# Altium footprint library 电容封装库.PcbLib: 100 footprints (part 5 of 7)
Each footprint in its own frame and in the unit in brackets; x right, y up, seen from the top. Pads: shape width x height; smd on the part's side, far side on the other; paste and mask are expansions set on the pad; w line width, h text height; cw(c..) or ccw(c..) is an arc to the next point about the centre after c.
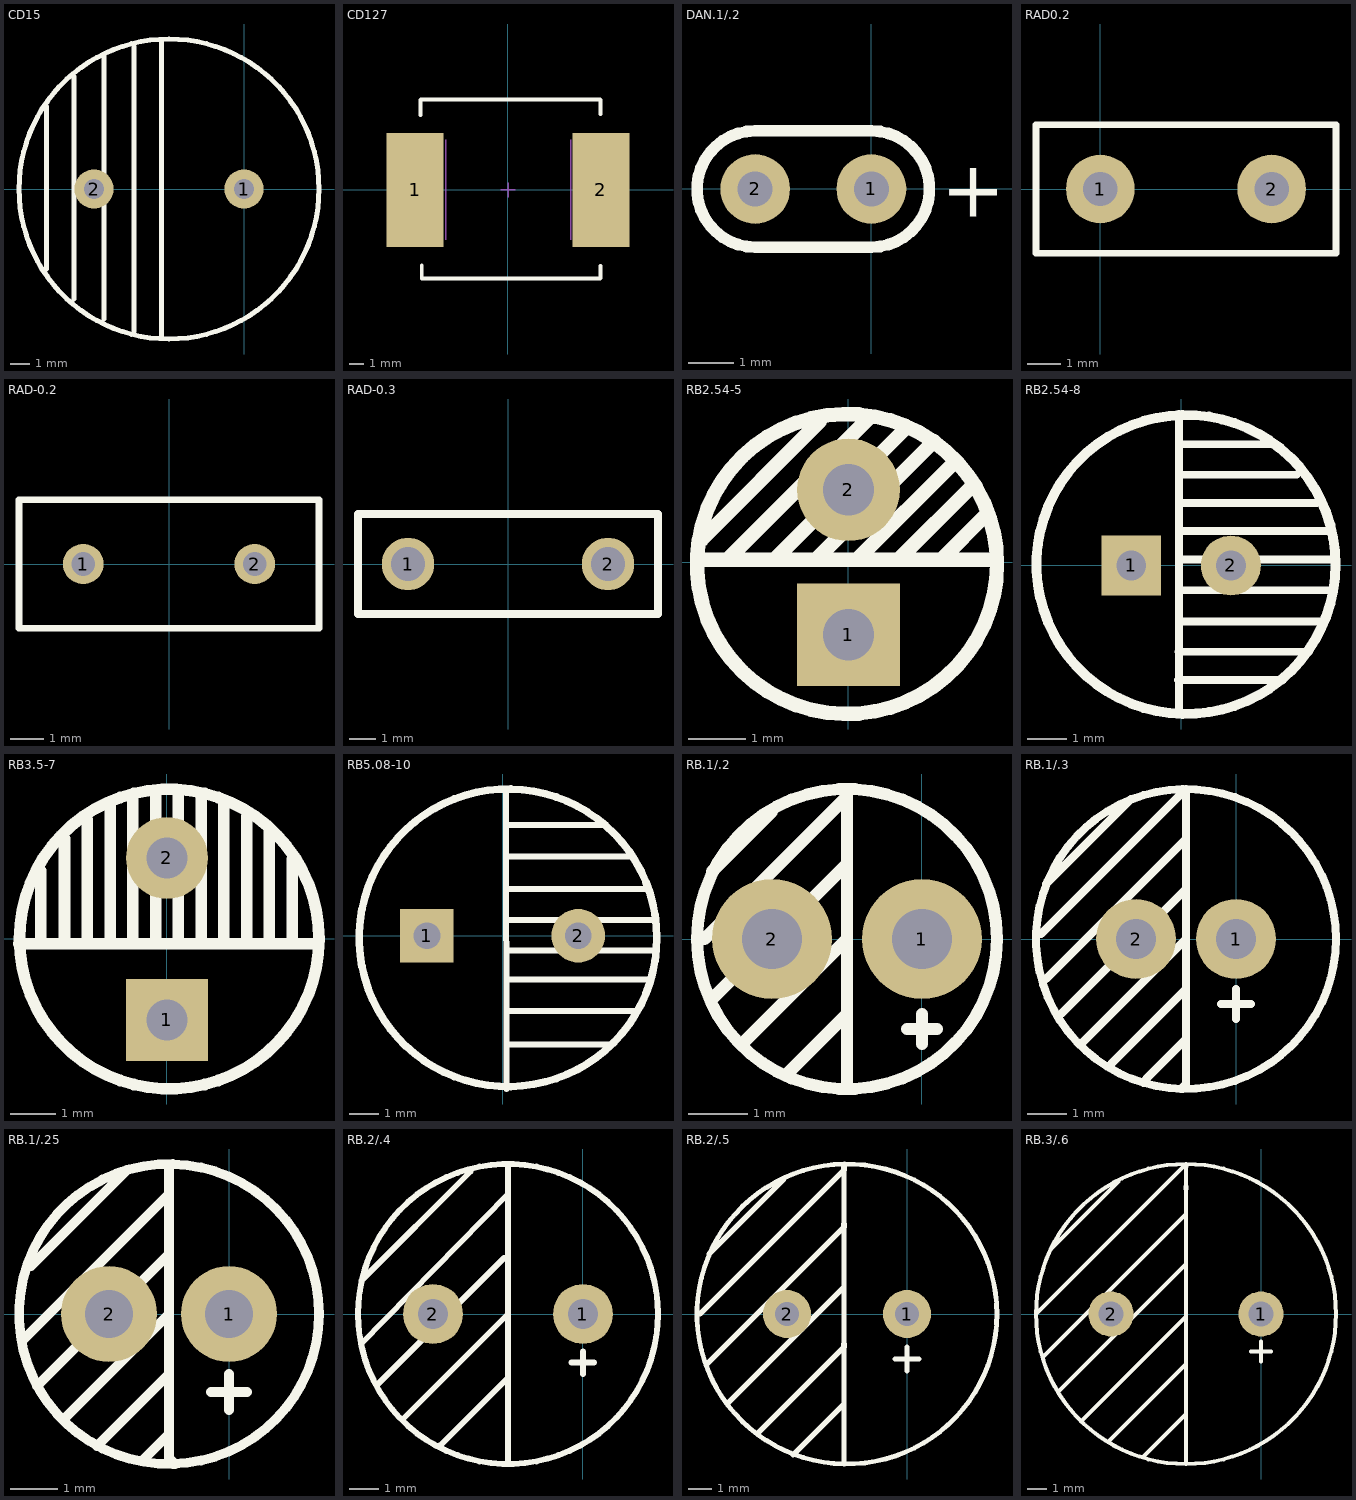
[diagram p4: the footprints below, top view; thin cyan lines are the x and y axes]

## CD15 [mm]
pads (2):
  round 2 hole 1: 1(0,0) 2(-7.62,0)
Top Overlay:
  circle w0.254: c-3.81,0 r7.62
  lines w0.254: -10.033,-4.064 -10.033,4.191 ; -8.636,-5.588 -8.636,5.715 ; -7.112,-6.604 -7.112,6.731 ; -5.588,-7.239 -5.588,7.239 ; -4.191,-7.493 -4.191,7.493

## CD127 [mm]
pads (2):
  rect 4x8 smd: 1(-6.5,0) 2(6.5,0)
Top Overlay:
  lines w0.254: -6.121,5.232 -6.121,6.299 -6.096,6.325 6.452,6.325 6.477,6.299 6.477,5.309 ; -6.045,-5.283 -6.045,-6.198 6.452,-6.198 6.477,-6.172 6.477,-5.309
Mechanical 15:
  lines w0.1: -4.375,-3.5 -4.375,3.5 ; -0.5,0 0.5,0 ; 0,-0.5 0,0.5 ; 4.375,-3.5 4.375,3.5
3D body: height 6.7, standoff 0, extent -6.048,-6.172 6.452,6.328

## DAN.1/.2 [mil]
pads (2):
  round 60 hole 30: 1(0,0) 2(-100,0)
Top Overlay:
  lines w10: -100,-50 cw(c-100,0) -100,50 0,50 cw(c0,0) 0,-50 -100,-50
  text "+" at 60,-24 h48

## RAD0.2 [mil]
pads (2):
  round 80 hole 40: 1(0,0) 2(200,0)
Top Overlay:
  lines w8: -75,-75 275,-75 275,75 -75,75 -75,-75

## RAD-0.2 [mm] "Radial Cap, Thru-Hole; 2 Leads; 0.2 in Pin Spacing"
pads (2):
  round 1.2 hole 0.7: 1(-2.54,0) 2(2.54,0)
Top Overlay:
  lines w0.2: -4.445,-1.905 4.445,-1.905 4.445,1.905 -4.445,1.905 -4.445,-1.905

## RAD-0.3 [mm]
height 1.99
pads (2):
  round 2 hole 1.3: 1(-3.81,0) 2(3.81,0)
Top Overlay:
  lines w0.305: -5.715,-1.905 5.715,-1.905 5.715,1.905 -5.715,1.905 -5.715,-1.905
3D body: height 5, standoff 0, extent -5.61,-1 5.59,1
3D body: height 1, standoff 0, extent 3.19,-0.599 4.385,0.599
3D body: height 1, standoff 0, extent -4.43,-0.599 -3.235,0.599

## RB2.54-5 [mm] "直插电解电容"
pads (2):
  rect 1.8x1.8 hole 0.9: 1(0,-1.27)
  round 1.8 hole 0.9: 2(0,1.27)
Top Overlay:
  circle w0.254: c-0.025,-0.03 r2.629
  lines w0.254: -1.275,0.07 1,2.345 -1.275,0.07 ; -1.275,0.07 -1.275,0.045 -1.275,0.07 ; 0.925,0.095 2.15,1.32 0.925,0.095 ; 0.925,0.095 0.925,0.07 0.925,0.095 ; -2.65,0.045 2.525,0.045 -2.65,0.045 ; -2.575,0.395 -0.5,2.47 -2.575,0.395 ; -2.1,0.07 0.375,2.545 -2.1,0.07 ; -0.575,0.045 1.5,2.12 -0.575,0.045 ; 0.175,0.07 1.85,1.745 0.175,0.07 ; 1.65,0.07 2.4,0.82 1.65,0.07
3D body: height 1, standoff 0, extent -0.498,0.732 0.498,1.73
3D body: height 1, standoff 0, extent -0.5,-1.769 0.496,-0.771
3D body: height 11.7, standoff -3.4, extent -2.57,-2.529 2.509,2.549

## RB2.54-8 [mil] "直插电解电容"
pads (2):
  rect 60x60 hole 30: 1(-50,0)
  round 60 hole 30: 2(50,0)
Top Overlay:
  circle w10: c4.96,1 r150.04
  lines w7.87: -2.94,-114.96 102.18,-114.96 ; -2.54,-86.61 128.56,-86.61 ; -2.15,-146.85 -2.15,151.97 ; -2.15,-56.3 141.94,-56.3 ; -2.15,-24.8 153.36,-24.8 ; -2.15,5.91 150.09,5.91 ; -2.15,34.65 148.24,34.65 ; -2.15,62.6 136.04,62.6 ; -2.15,90.94 115.96,90.94 ; -2.15,121.65 94.31,121.65 ; 42.73,-143.7 44.31,-143.7
3D body: height 453.76, standoff -128.81, extent -130,-125.01 120.03,125.01

## RB3.5-7 [mm] "直插电解电容"
pads (2):
  rect 1.8x1.8 hole 0.9: 1(0,-1.778)
  round 1.8 hole 0.9: 2(0,1.778)
Top Overlay:
  circle w0.254: c0.05,-0.003 r3.289
  lines w0.254: -3.25,-0.103 3.325,-0.103 ; -2.775,-0.078 -2.775,1.497 ; -2.25,-0.028 -2.25,2.197 ; -1.75,-0.028 -1.75,2.622 ; -1.25,-0.078 -1.25,2.972 ; -0.75,-0.053 -0.75,3.122 ; -0.25,-0.053 -0.25,3.197 ; 0.25,-0.053 0.25,3.247 ; 0.75,-0.028 0.75,3.147 ; 1.25,-0.028 1.25,2.947 ; 1.75,-0.053 1.75,2.697 ; 2.25,-0.053 2.25,2.397 ; 2.75,-0.028 2.75,1.747
3D body: height 11.7, standoff -3.4, extent -2.42,-2.357 2.659,2.721

## RB5.08-10 [mm] "直插电解电容"
pads (2):
  rect 1.8x1.8 hole 0.9: 1(-2.542,0)
  round 1.8 hole 0.9: 2(2.542,0)
Top Overlay:
  circle w0.254: c0.182,-0.07 r5
  lines w0.2: 0.12,4.81 0.132,-5.15 ; 0.174,3.718 3.384,3.718 ; 0.175,2.655 4.307,2.655 ; 0.177,1.569 4.782,1.569 ; 0.178,0.528 5.161,0.528 ; 0.179,-0.491 5.152,-0.491 ; 0.181,-1.466 4.952,-1.466 ; 0.182,-2.529 4.513,-2.529 ; 0.221,-3.65 3.692,-3.65
3D body: height 16.53, standoff -3.74, extent -5.025,-5.025 5.026,5.026

## RB.1/.2 [mil]
pads (2):
  round 80 hole 40: 1(0,0) 2(-100,0)
Top Overlay:
  circle w8: c-50,0 r100
  lines w8: -145,0 -50,95 -50,-95 ; -140,-40 -50,50 ; -140,45 -100,85 ; -120,-70 -50,0 ; -90,-90 -50,-50 ; -10,-60 10,-60 ; 0,-70 0,-50

## RB.1/.3 [mil]
pads (2):
  round 80 hole 40: 1(0,0) 2(-100,0)
Top Overlay:
  circle w8: c-50,0 r150
  lines w8: -195,5 -50,150 -50,-145 -55,-150 ; -190,-40 -50,100 ; -190,55 -105,140 ; -175,-75 -50,50 ; -155,-105 -50,0 ; -125,-125 -50,-50 ; -90,-140 -50,-100 ; -15,-65 15,-65 ; 0,-80 0,-50

## RB.1/.25 [mil]
pads (2):
  round 80 hole 40: 1(0,0) 2(-100,0)
Top Overlay:
  circle w8: c-50,0 r125
  lines w8: -170,-20 -50,100 ; -165,40 -85,120 ; -160,-60 -50,50 ; -135,-85 -50,0 ; -110,-110 -50,-50 ; -70,-120 -50,-100 -50,-105 ; -50,120 -50,-120 -45,-125 ; -15,-65 15,-65 ; 0,-80 0,-50

## RB.2/.4 [mil]
pads (2):
  round 80 hole 40: 1(0,0) 2(-200,0)
Top Overlay:
  circle w8: c-100,0 r200
  lines w8: -296,-40 -100,160 ; -295,45 -150,190 ; -275,-95 -105,75 -100,75 ; -240,-140 -100,0 ; -190,-175 -100,-85 ; -100,-200 -100,200 ; -15,-65 15,-65 ; 0,-80 0,-50

## RB.2/.5 [mil]
pads (2):
  round 80 hole 40: 1(0,0) 2(-200,0)
Top Overlay:
  circle w8: c-100,0 r250
  lines w8: -345,0 -105,240 ; -335,-85 -105,145 ; -330,100 -205,225 ; -300,-150 -105,45 ; -250,-200 -105,-55 ; -190,-235 -105,-150 ; -105,-250 -105,245 ; -20,-75 20,-75 ; 0,-95 0,-55
  lines w10: -105,-55 -105,-50 ; -105,145 -105,150 ; -105,240 -105,245

## RB.3/.6 [mil]
pads (2):
  round 90 hole 50: 1(0,0) 2(-300,0)
Top Overlay:
  circle w8: c-150,0 r300
  lines w8: -450,0 -155,295 ; -435,-85 -150,200 ; -420,130 -285,265 ; -405,-155 -150,100 ; -360,-215 -150,-5 ; -305,-255 -150,-100 ; -235,-285 -150,-200 ; -150,-300 -150,295 ; -20,-75 20,-75 ; 0,-95 0,-55
  lines w10: -155,295 -150,295 ; -150,250 -150,255